# Altium footprint library main.PcbLib: 217 footprints (part 3 of 14)
Each footprint in its own frame and in the unit in brackets; x right, y up, seen from the top. Pads: shape width x height; smd on the part's side, far side on the other; paste and mask are expansions set on the pad; w line width, h text height; cw(c..) or ccw(c..) is an arc to the next point about the centre after c.
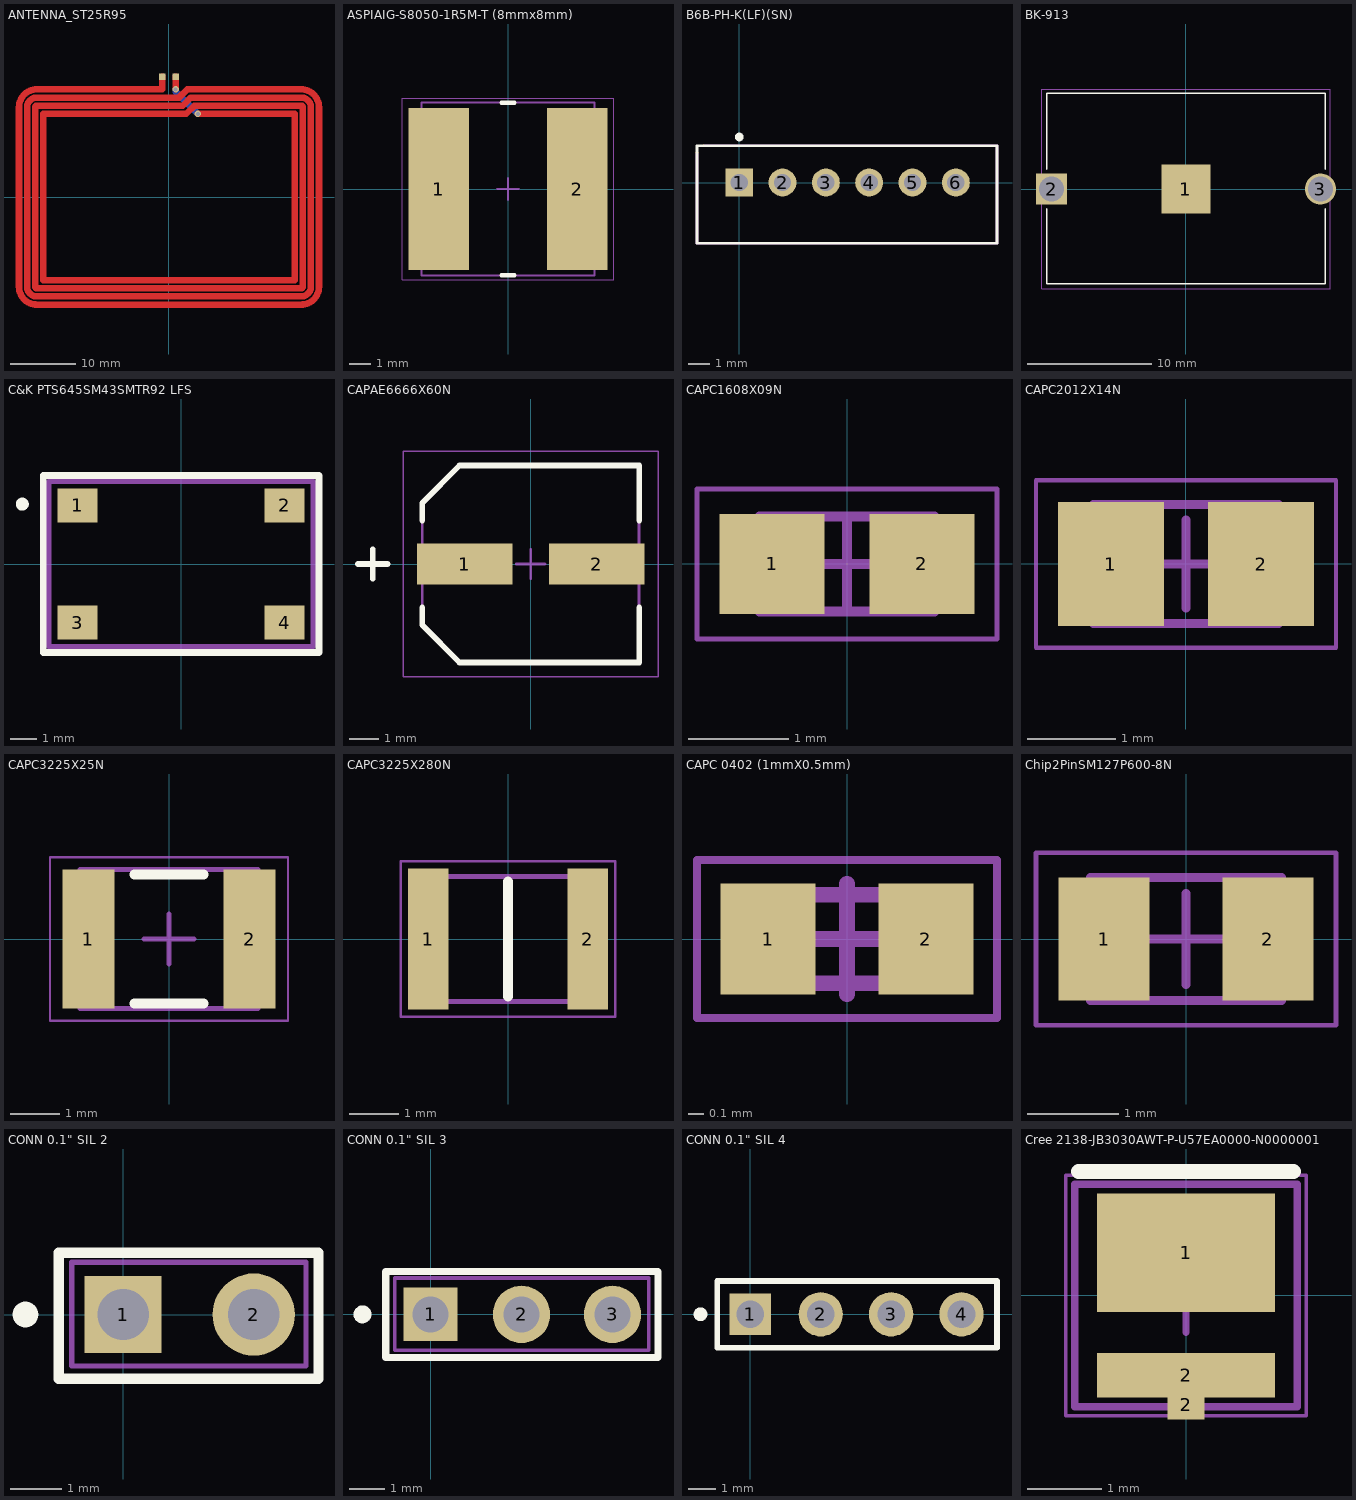
[diagram p2: the footprints below, top view; thin cyan lines are the x and y axes]

## ANTENNA_ST25R95 [mm] "ANTENNA_ST25R95"
pads (2):
  rect 1x1 smd: 1(-1,18.5) 2(1,18.5)
via 4.426,12.8 diameter 1 hole 0.6
via 1,16.55 diameter 1 hole 0.6
Top Layer:
  lines w1: -1,18.5 -1,16.55 -20.25,16.55 ccw(c-20.25,13.8) -23,13.8 -23,-13.7 ccw(c-20.25,-13.7) -20.25,-16.45 20.25,-16.45 ccw(c20.25,-13.7) 23,-13.7 23,13.8 ccw(c20.25,13.8) 20.25,16.55 2.8,16.55 1.55,15.3 -20.25,15.3 ccw(c-20.25,13.8) -21.75,13.8 -21.75,-13.7 ccw(c-20.25,-13.7) -20.25,-15.2 20.25,-15.2 ccw(c20.25,-13.7) 21.75,-13.7 21.75,13.8 ccw(c20.25,13.8) 20.25,15.3 3.35,15.3 2.1,14.05 -20.25,14.05 ccw(c-20.25,13.8) -20.5,13.8 -20.5,-13.7 ccw(c-20.25,-13.7) -20.25,-13.95 20.25,-13.95 ccw(c20.25,-13.7) 20.5,-13.7 20.5,13.8 ccw(c20.25,13.8) 20.25,14.05 3.9,14.05 2.65,12.8 -19.25,12.8 -19.25,-12.7 19.25,-12.7 19.25,12.8 4.425,12.8 ; 1,16.55 1,18.5
Bottom Layer:
  lines w1: 1,16.215 1,16.55 ; 1.011,16.215 4.436,12.79

## ASPIAIG-S8050-1R5M-T (8mmx8mm) [mm] "ASPIAIG-S8050-1R5M-T (8mmx8mm)"
height 5.2
pads (2):
  rect 2.8x7.5 smd: 1(-3.2,0) 2(3.2,0)
Top Overlay:
  lines w0.2: -0.3,-4 0.3,-4 ; -0.3,4 0.3,4
Mechanical 7:
  text ".Designator" at -2.1,-0.4 h1.52
Mechanical 13:
  lines w0.1: -4,-4 4,-4 4,4 -4,4 -4,-4
Mechanical 15:
  lines w0.05: -4.9,-4.2 4.9,-4.2 4.9,4.2 -4.9,4.2 -4.9,-4.2
  lines w0.1: -0.5,0 0.5,0 ; 0,-0.5 0,0.5
3D body: height 5, standoff 0, extent -4,-4 4,4

## B6B-PH-K(LF)(SN) [mm] "B6B-PH-K(LF)(SN)"
height 1.8
pads (6):
  rect 1.29x1.29 hole 0.8: 1(0,0)
  round 1.29 hole 0.8: 2(2,0) 3(4,0) 4(6,0) 5(8,0) 6(10,0)
Top Overlay:
  circle w0.2: c0,2.1 r0.1
  lines w0.127: -1.95,-2.8 -1.95,1.7 11.9,1.7 11.9,-2.8 -1.95,-2.8
Mechanical 7:
  text ".Designator" at -1.2,-3.9 h1.52
Mechanical 15:
  lines w0.127: -1.95,1.35 -1.95,-2.8 11.9,-2.8 11.9,1.25 ; -1.6,1.7 11.9,1.7 11.9,0
3D body "B6B-PH-K-S.STEP": height 6, standoff -3.4, extent -1.95,-2.8 11.95,1.7

## BK-913 [mm] "BK-913"
pads (3):
  rect 3.96x3.96 smd: 1(0,0)
  rect 2.5x2.5 hole 2: 2(-10.8,0)
  round 2.5 hole 2: 3(10.8,0)
Top Overlay:
  lines w0.127: -11.2,-1.6 -11.2,-7.6 11.2,-7.6 11.2,-1.6 ; -11.2,1.6 -11.2,7.7 11.2,7.7 11.2,1.6
Mechanical 7:
  text ".Designator" at -2,-4 h0.76
Mechanical 15:
  lines w0.05: -11.6,-8 11.6,-8 11.6,8 -11.6,8 -11.6,-8
3D body "BK-913.STEP": height 5.06, standoff -2, extent -11.175,-7.62 11.175,7.671

## C&K PTS645SM43SMTR92 LFS [mm] "SWITCH TACTILE SPST-NO 0.05A 12V"
height 4.4
pads (4):
  rect 1.55x1.3 smd: 1(-3.975,2.25) 2(3.975,2.25) 3(-3.975,-2.25) 4(3.975,-2.25)
Top Overlay:
  circle w0.25: c-6.1,2.3 r0.125
  lines w0.254: -5.3,-3.4 5.3,-3.4 5.3,3.4 -5.3,3.4 -5.3,-3.4
Mechanical 7:
  text ".Designator" at -4.262,-1.046 h1.52
Mechanical 15:
  lines w0.2: -5.08,-3.175 -5.08,3.175 5.08,3.175 5.08,-3.175 -5.08,-3.175
3D body "97m01645fp.stp": height 4.3, standoff 0, extent -4.5,-3 4.5,3

## CAPAE6666X60N [mm] "Aluminum Electrolytic Capacitor, Body 7.30x6.60x6.00mm, IPC Medium Density"
height 6
pads (2):
  rect 3.3x1.4 smd: 1(-2.275,0) 2(2.275,0)
Top Overlay:
  lines w0.2: -5.969,0 -4.953,0 ; -5.461,-0.508 -5.461,0.508 ; -3.75,-1.5 -3.75,-2.113 -2.462,-3.4 3.75,-3.4 3.75,-1.5 ; -3.75,1.5 -3.75,2.113 -2.462,3.4 3.75,3.4 3.75,1.5
Mechanical 7:
  text ".Designator" at -3.81,-0.889 h1.52
Mechanical 13:
  lines w0.1: -3.75,-2.113 -2.462,-3.4 3.75,-3.4 3.75,3.4 -2.462,3.4 -3.75,2.113 -3.75,-2.113
Mechanical 15:
  lines w0.05: -4.4,-3.9 -4.4,3.9 4.4,3.9 4.4,-3.9 -4.4,-3.9
  lines w0.1: -0.5,0 0.5,0 ; 0,-0.5 0,0.5
3D body: height 2, standoff 0, extent -3.75,-3.4 3.75,3.4
3D body: height 6, standoff 0, extent -3.4,-3.4 3.4,3.4

## CAPC1608X09N [mm] "Chip Capacitor, 2-Leads, Body 1.60x0.80mm, IPC Medium Density"
height 0.92
pads (2):
  rect 1.05x1 smd: 1(-0.75,0) 2(0.75,0)
Mechanical 7:
  text ".Designator" at -0.762,-0.254 h0.76
Mechanical 13:
  lines w0.1: -0.875,-0.475 -0.875,0.475 0.875,0.475 0.875,-0.475 -0.875,-0.475
Mechanical 15:
  lines w0.05: -1.5,-0.75 -1.5,0.75 1.5,0.75 1.5,-0.75 -1.5,-0.75
  lines w0.1: -0.475,0 0.475,0 ; 0,-0.475 0,0.475
3D body "CAPC1608X09N.step": height 0.92, standoff 0, extent -0.875,-0.475 0.875,0.475

## CAPC2012X14N [mm] "Chip Capacitor, 2-Leads, Body 2.00x1.25mm, IPC Medium Density"
height 1.35
pads (2):
  rect 1.2x1.4 smd: 1(-0.85,0) 2(0.85,0)
Mechanical 7:
  text ".Designator" at -0.889,-0.381 h0.76
Mechanical 13:
  lines w0.1: -1.05,-0.675 -1.05,0.675 1.05,0.675 1.05,-0.675 -1.05,-0.675
Mechanical 15:
  lines w0.05: -1.7,-0.95 -1.7,0.95 1.7,0.95 1.7,-0.95 -1.7,-0.95
  lines w0.1: -0.5,0 0.5,0 ; 0,-0.5 0,0.5
3D body: height 1.35, standoff 0, extent -0.6,-0.675 0.6,0.675
3D body: height 1.35, standoff 0, extent -1.05,-0.675 -0.6,0.675
3D body: height 1.35, standoff 0, extent 0.6,-0.675 1.05,0.675

## CAPC3225X25N [mm] "Chip Capacitor, 2-Leads, Body 3.20x2.50mm, IPC Medium Density"
height 2.5
pads (2):
  rect 1.05x2.8 smd: 1(-1.625,0) 2(1.625,0)
Top Overlay:
  lines w0.2: -0.7,-1.3 0.7,-1.3 ; -0.7,1.3 0.7,1.3
Mechanical 7:
  text ".Designator" at -1.739,-0.285 h0.76
Mechanical 13:
  lines w0.1: -1.8,-1.4 1.8,-1.4 1.8,1.4 -1.8,1.4 -1.8,-1.4
Mechanical 15:
  lines w0.05: -2.4,-1.65 2.4,-1.65 2.4,1.65 -2.4,1.65 -2.4,-1.65
  lines w0.1: -0.5,0 0.5,0 ; 0,-0.5 0,0.5
3D body: height 2.5, standoff 0, extent 1.55,-1.4 1.8,1.4
3D body: height 2.5, standoff 0, extent -1.8,-1.4 -1.55,1.4
3D body: height 2.5, standoff 0, extent -1.55,-1.4 1.55,1.4

## CAPC3225X280N [mm]
pads (2):
  rect 0.81x2.82 smd: 1(-1.6,0) 2(1.6,0)
Top Overlay:
  lines w0.2: 0,-1.15 0,1.15
Mechanical 13:
  lines w0.1: -1.6,-1.25 -1.6,1.25 1.6,1.25 1.6,-1.25 -1.6,-1.25
Mechanical 15:
  lines w0.05: -2.155,-1.56 -2.155,1.56 2.155,1.56 2.155,-1.56 -2.155,-1.56
3D body "CGA6P3X7R1H335K250AB.stp": height 2.77, standoff 0.03, extent -1.4,-1.225 1.4,1.225

## CAPC 0402 (1mmX0.5mm) [mm] "CAPC 0402 (1mmX0.5mm)"
height 0.5
pads (2):
  rect 0.6x0.7 smd: 1(-0.5,0) 2(0.5,0)
Mechanical 7:
  text ".Designator" at -0.762,-0.254 h0.76
Mechanical 13:
  lines w0.1: -0.53,-0.28 0.53,-0.28 0.53,0.28 -0.53,0.28 -0.53,-0.28
Mechanical 15:
  lines w0.05: -0.95,-0.5 0.95,-0.5 0.95,0.5 -0.95,0.5 -0.95,-0.5
  lines w0.1: -0.35,0 0.35,0 ; 0,-0.35 0,0.35
3D body "User Library-cap_0402.STEP": height 0.5, standoff 0, extent -0.5,-0.25 0.5,0.25

## Chip2PinSM127P600-8N [mm]
height 0.6
pads (2):
  rect 1x1.35 smd: 1(-0.9,0) 2(0.9,0)
Mechanical 7:
  text ".Designator" at -1.17,-0.385 h0.76
Mechanical 13:
  lines w0.1: -1.05,-0.675 -1.05,0.675 1.05,0.675 1.05,-0.675 -1.05,-0.675
Mechanical 15:
  lines w0.05: -1.65,-0.95 -1.65,0.95 1.65,0.95 1.65,-0.95 -1.65,-0.95
  lines w0.1: -0.5,0 0.5,0 ; 0,-0.5 0,0.5
3D body: height 0.6, standoff 0, extent -0.7,-0.675 0.7,0.675
3D body: height 0.6, standoff 0, extent -1.05,-0.675 -0.7,0.675
3D body: height 0.6, standoff 0, extent 0.7,-0.675 1.05,0.675

## CONN 0.1" SIL 2 [mm]
height 1.8
pads (2):
  rect 1.5x1.5 hole 1: 1(0,0)
  round 1.6 hole 1: 2(2.54,0)
Top Overlay:
  circle w0.25: c-1.9,0 r0.125
  lines w0.2: -1.25,-1.25 3.8,-1.25 3.8,1.2 -1.25,1.2 -1.25,-1.25
Mechanical 7:
  text ".Designator" at -0.889,-0.762 h1.52
Mechanical 13:
  lines w0.1: -1,-1 3.556,-1 3.556,1.016 -1,1.016 -1,-1
Mechanical 15:
  lines w0.05: -0.5,0 0.5,0 ; 0,-0.5 0,0.5 ; -1.25,-1.25 3.81,-1.25 3.81,1.27 -1.25,1.27 -1.25,-1.25
3D body "User Library-Header1x2.STEP": height 8.79, standoff -2.19, extent -1.27,-1.27 3.81,1.27

## CONN 0.1" SIL 3 [mm]
height 0.025
pads (3):
  rect 1.5x1.5 hole 1: 1(0,0)
  round 1.6 hole 1: 2(2.54,0) 3(5.08,0)
Top Overlay:
  circle w0.25: c-1.9,0 r0.125
  lines w0.2: -1.25,-1.2 6.35,-1.2 6.35,1.2 -1.25,1.2 -1.25,-1.2
Mechanical 7:
  text ".Designator" at 0.254,-0.635 h1.52
Mechanical 13:
  lines w0.1: -1,-1 6.096,-1 6.096,1.016 -1,1.016 -1,-1
Mechanical 15:
  lines w0.05: -0.5,0 0.5,0 ; 0,-0.5 0,0.5 ; -1.25,-1.25 6.35,-1.25 6.35,1.27 -1.25,1.27 -1.25,-1.25
3D body "User Library-Header_Male_3Pin.STEP": height 8.54, standoff -3, extent -1.27,-1.245 6.35,1.245

## CONN 0.1" SIL 4 [mm]
height 0.025
pads (4):
  rect 1.5x1.5 hole 1: 1(0,0)
  round 1.6 hole 1: 2(2.54,0) 3(5.08,0) 4(7.62,0)
Top Overlay:
  circle w0.25: c-1.8,0 r0.125
  lines w0.2: -1.2,-1.2 -1.2,1.2 8.9,1.2 8.9,-1.2 -1.2,-1.2
Mechanical 7:
  text ".Designator" at 1.016,-0.635 h1.52
Mechanical 15:
  lines w0.05: -0.5,0 0.5,0 ; 0,-0.5 0,0.5 ; -1.25,-1.25 -1.25,1.27 8.89,1.27 8.89,-1.25 -1.25,-1.25
3D body "65781.stp": height 8.08, standoff -3.46, extent -1.27,-1.27 8.89,1.27

## Cree 2138-JB3030AWT-P-U57EA0000-N0000001 [mm] "Cree 2138-JB3030AWT-P-U57EA0000-N0000001"
height 0.72
pads (3):
  rect 2.4x1.6 smd: 1(0,0.575)
  rect 0.5x0.4 smd: 2(0,-1.475)
  rect 2.4x0.6 smd: 2(0,-1.075)
Top Overlay:
  lines w0.2: -1.45,1.675 1.45,1.675
Mechanical 7:
  text ".Designator" at -1.25,-0.45 h0.76
Mechanical 13:
  lines w0.1: -1.5,-1.5 -1.5,1.5 1.5,1.5 1.5,-1.5 -1.5,-1.5
Mechanical 15:
  lines w0.05: -1.625,-1.625 -1.625,1.625 1.625,1.625 1.625,-1.625 -1.625,-1.625
  lines w0.1: -0.5,0 0.5,0 ; 0,-0.5 0,0.5
3D body: height 0.52, standoff 0, extent -1.5,-1.5 1.5,1.5